# Altium integrated library Ortho4Exent.IntLib: 21 symbols
Pins are listed as number, name and electrical type; pins without a type are passive.

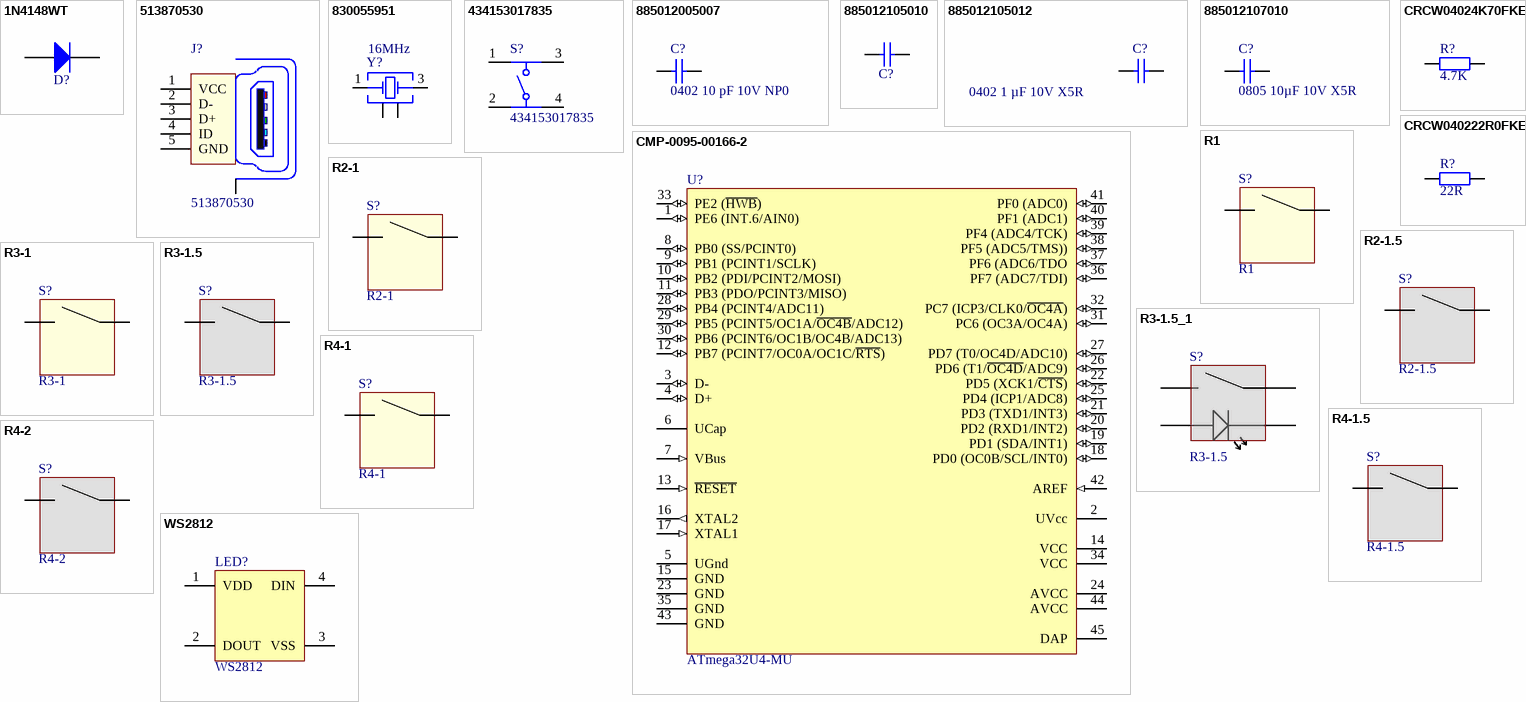
[diagram p0: symbols 1N4148WT to WS2812]

## 1N4148WT
designator D?, comment Diode  (value not drawn)
Default Diode; MANUF: ON Semi; MANUFCODE: 1N4148WT; DESCIPTION: DIODE GEN PURP 80V 125MA SOD323; COMPATIBLES: True; NoPins: 2; GENERIC: 1N4148; DIGIKEY: 1N4148WSFSTR-ND; FARNELL: 2453270; SMD: True; PACKAGE: SOD323-FL
footprint SOD323FL
pins: 1 A, 2 K

## 513870530
designator J?
Mini USB, B-Receptacle, Right-Angle, Short Body, Surface Mount Solder Tails and Through Hole Shell Tabs, with Cover Tape, Reflow DIP Type, Lead-Free; ComponentLink1 Description: Manufacturer; ComponentLink2 Description: Datasheet; ComponentLink1URL: http://www.we-online.de; ComponentLink2URL: http://katalog.we-online.de/em/datasheet/65100516121.pdf
footprint 513870530
pins: 1 VCC, 2 D-, 3 D+, 4 ID, 5 GND, TAB

## 830055951
designator Y?, comment 16MHz
WE-XTAL Quartz Crystal, SMT, CFPX-180, 16MHz, +/-20ppm; Manufacturer Part Number: 830055951; Manufacturer: Wurth Elektronik; Frequency Stability: +/-30ppm; Load Capacitance: 18pF; ComponentLink1Description: Manufacturer; ComponentLink1URL: http://www.we-online.de; ComponentLink2Description: Datasheet; ComponentLink2URL: https://katalog.we-online.com/pbs/datasheet/830055951.pdf; Operating Temperature: -40 to +85degC; Packaging: Tape and Reel; Published Date: July 2020; Size: CFPX-180; Frequency: 16MHz; Frequency Tolerance: +/-20ppm; Mounting Technology: SMT
footprint WE-XTAL_CFPX-180
pins: 1 Crystal, 2 GND, 3 Crystal, 4 GND

## 434153017835
designator S?
WS-TASV J-Bend SMT Tact Switch, 3.5x2.9x1.7mm, 350gf; Manufacturer: Wurth Elektronik; Rated Voltage: 12VDC; Rated Current: 50mA; Washable: No; ComponentLink1Description: Manufacturer; ComponentLink1URL: http://www.we-online.de; ComponentLink2Description: Datasheet; ComponentLink2URL: https://www.we-online.com/catalog/datasheet/434153017835.pdf; Operating Temperature: -40 to +85degC; Manufacturer Part Number: 434153017835; Published Date: November 2020; Contact Material: Stainless Steel; Size: 3.5x2.9x1.7mm; Mounting Technology: SMT; Contact Plating: Silver; Operation Force: 350gf; Packaging: Tape and Reel; Terminal Material: Copper Alloy; Terminal Plating: Silver
footprint 434153017835 (Tact Switch, SMD, body 3.5x2.9mm)
pins: 1, 2, 3, 4

## 885012005007
designator C?, comment SCH: 0402 10 pF 10V NP0  (hidden comment: Cap)
MANUFCODE: 885012005007; MANUF: WE; DESCIPTION: CAP SMD 0402 10 pF 10V NP0; VALUE: 10 pF; NoPins: 2; SUPPLY: SUB; VOLTAGE: 10; TECH: NP0; DIGIKEY: 732-7425-2-ND; SMD: YES
footprint CAPC0402N
pins: 1, 2

## 885012105010
designator C?, comment Cap  (value not drawn)
MANUFCODE: 885012105010; MANUF: WE; SCH: 0402 100 nF 10V X5R; DESCIPTION: CAP SMD 0402 100 nF 10V X5R; VALUE: 100 nF; NoPins: 2; SUPPLY: SUB; VOLTAGE: 10; TECH: X5R; DIGIKEY: 732-7487-2-ND; SMD: YES
footprint CAPC0402N
pins: 1, 2

## 885012105012
designator C?, comment SCH: 0402 1 µF 10V X5R  (hidden comment: Cap)
MANUFCODE: 885012105012; MANUF: WE; DESCIPTION: CAP SMD 0402 1 µF 10V X5R; VALUE: 1 µF; NoPins: 2; SUPPLY: SUB; VOLTAGE: 10; TECH: X5R; DIGIKEY: 732-7489-2-ND; SMD: YES
footprint CAPC0402N
pins: 1, 2

## 885012107010
designator C?, comment SCH: 0805 10µF 10V X5R  (hidden comment: Cap)
MANUFCODE: 885012107010; MANUF: WE; DESCIPTION: CAP SMD 0805 10 µF 10 V X5R; VALUE: 10 µF; NoPins: 2; SUPPLY: SUB; VOLTAGE: 10; TECH: X5R; TOLERANCE: ±20%; DIGIKEY: 732-7620-2-ND; SMD: YES
footprint CAPC0805N
pins: 1, 2

## CMP-0095-00166-2
designator U?, comment ATmega32U4-MU
8-bit AVR Microcontroller, 2.7-5.5V, 16MHz, 32KB Flash, 1KB EEPROM, 2.5KB SRAM, USB Controller, 44-pin QFN, Industrial Grade (-40°C to 85°C), Ext Osc; Manufacturer: Microchip / Atmel; PackageVersion: revG, Sep-2009; PackageReference: 44PW; ComponentLink1URL: http://www.atmel.com/; PackageDescription: 44-Pin Quad Flat No-Lead Package, 7 x 7 mm Body, 0.5 mm Pitch (QFN); ComponentLink3Description: ATmega16U4 ATmega32U4 Summary; RevisionNote: DatasheetVersion, PackageVersion & PCB updated. URLs added.; ComponentLink2Description: ATmega16U4/32U4 Datasheet; ComponentLink1Description: Manufacturer URL; ComponentLink3URL: http://www.atmel.com/dyn/resources/prod_documents/7766S.pdf; DatasheetVersion: revF, Nov-2010; ComponentLink2URL: http://www.atmel.com/dyn/resources/prod_documents/doc7766.pdf; Code_JEDEC: MO-220-VKKD-1; Manufacturer Part Number: ATMEGA32U4-MU
footprint 44PW_M (QFN, 44-Leads, Body 7x7mm, Pitch 0.5mm, Thermal Pad 5.3x5.3mm, IPC Low Density)
footprint 44PW_L (QFN, 44-Leads, Body 7x7mm, Pitch 0.5mm, Thermal Pad 5.3x5.3mm, IPC High Density)
footprint 44PW_N (QFN, 44-Leads, Body 7x7mm, Pitch 0.5mm, Thermal Pad 5.3x5.3mm, IPC Medium Density)
pins: 1 PE6 (INT.6/AIN0) (io), 2 UVcc (power), 3 D- (io), 4 D+ (io), 5 UGnd (power), 6 UCap, 7 VBus (in), 8 PB0 (SS/PCINT0) (io), 9 PB1 (PCINT1/SCLK) (io), 10 PB2 (PDI/PCINT2/MOSI) (io), 11 PB3 (PDO/PCINT3/MISO) (io), 12 PB7 (PCINT7/OC0A/OC1C/~{RTS}) (io), 13 ~{RESET} (in), 14 VCC (power), 15 GND (power), 16 XTAL2 (out), 17 XTAL1 (in), 18 PD0 (OC0B/SCL/INT0) (io), 19 PD1 (SDA/INT1) (io), 20 PD2 (RXD1/INT2) (io), 21 PD3 (TXD1/INT3) (io), 22 PD5 (XCK1/~{CTS}) (io), 23 GND (power), 24 AVCC (power), 25 PD4 (ICP1/ADC8) (io), 26 PD6 (T1/~{OC4D}/ADC9) (io), 27 PD7 (T0/OC4D/ADC10) (io), 28 PB4 (PCINT4/ADC11) (io), 29 PB5 (PCINT5/OC1A/~{OC4B}/ADC12) (io), 30 PB6 (PCINT6/OC1B/OC4B/ADC13) (io), 31 PC6 (OC3A/OC4A) (io), 32 PC7 (ICP3/CLK0/~{OC4A}) (io), 33 PE2 (~{HWB}) (io), 34 VCC (power), 35 GND (power), 36 PF7 (ADC7/TDI) (io), 37 PF6 (ADC6/TDO (io), 38 PF5 (ADC5/TMS)) (io), 39 PF4 (ADC4/TCK) (io), 40 PF1 (ADC1) (io), 41 PF0 (ADC0) (io), 42 AREF (in), 43 GND (power), 44 AVCC (power), 45 DAP (power)

## CRCW04024K70FKED
designator R?, comment value 4.7K  (hidden comment: Res)
Resistor; MANUFCODE: CRCW04024K70FKED; MANUF: VISHAY; DESCR: RES SMD 4.7K OHM 1% 1/16W 100PPM 0402; COMPATIBLES: F1; NoPins: 2; SUPPLY: SUB; SCH: RES 4.7K 0402; DIGIKEY: 541-4.70KLCT-ND; FARNELL: TBD; SMD: YES
footprint RESC0402N
pins: 1, 2

## CRCW040222R0FKED
designator R?, comment value 22R  (hidden comment: Res)
Resistor; MANUFCODE: CRCW040222R0FKED; MANUF: VISHAY; DESCR: RES SMD 22 OHM 1% 1/16W 100PPM 0402; COMPATIBLES: F1; NoPins: 2; SUPPLY: SUB; SCH: RES 22R 0402; DIGIKEY: 541-22.0LCT-ND; FARNELL: TBD; SMD: YES
footprint RESC0402N
pins: 1, 2

## R1
designator S?
footprint R1 NOLED
pins: 1, 2

## R2-1
designator S?
footprint R2-1 NOLED
pins: 1, 2

## R2-1.5
designator S?
footprint R2-1.5 NOLED
pins: 1, 2

## R3-1
designator S?
footprint R3-1 NOLED
pins: 1, 2

## R3-1.5
designator S?
footprint R3-1.5 NOLED (Footprint not found)
pins: 1, 2

## R3-1.5_1
designator S?, comment R3-1.5
footprint R3-1.5 (Footprint not found)
pins: 1, 2, 3, 4

## R4-1
designator S?
footprint R4-1 NOLED
pins: 1, 2

## R4-1.5
designator S?
footprint R4-1.5 NOLED
pins: 1, 2

## R4-2
designator S?
footprint R4-2 NOLED 180
pins: 1, 2

## WS2812
designator LED?
footprint WS2812
pins: 1 VDD, 2 DOUT, 3 VSS, 4 DIN